# Altium footprint library SG__PCB_HOLE_Connector.PcbLib: 174 footprints (part 2 of 11)
Each footprint in its own frame and in the unit in brackets; x right, y up, seen from the top. Pads: shape width x height; smd on the part's side, far side on the other; paste and mask are expansions set on the pad; w line width, h text height; cw(c..) or ccw(c..) is an arc to the next point about the centre after c.
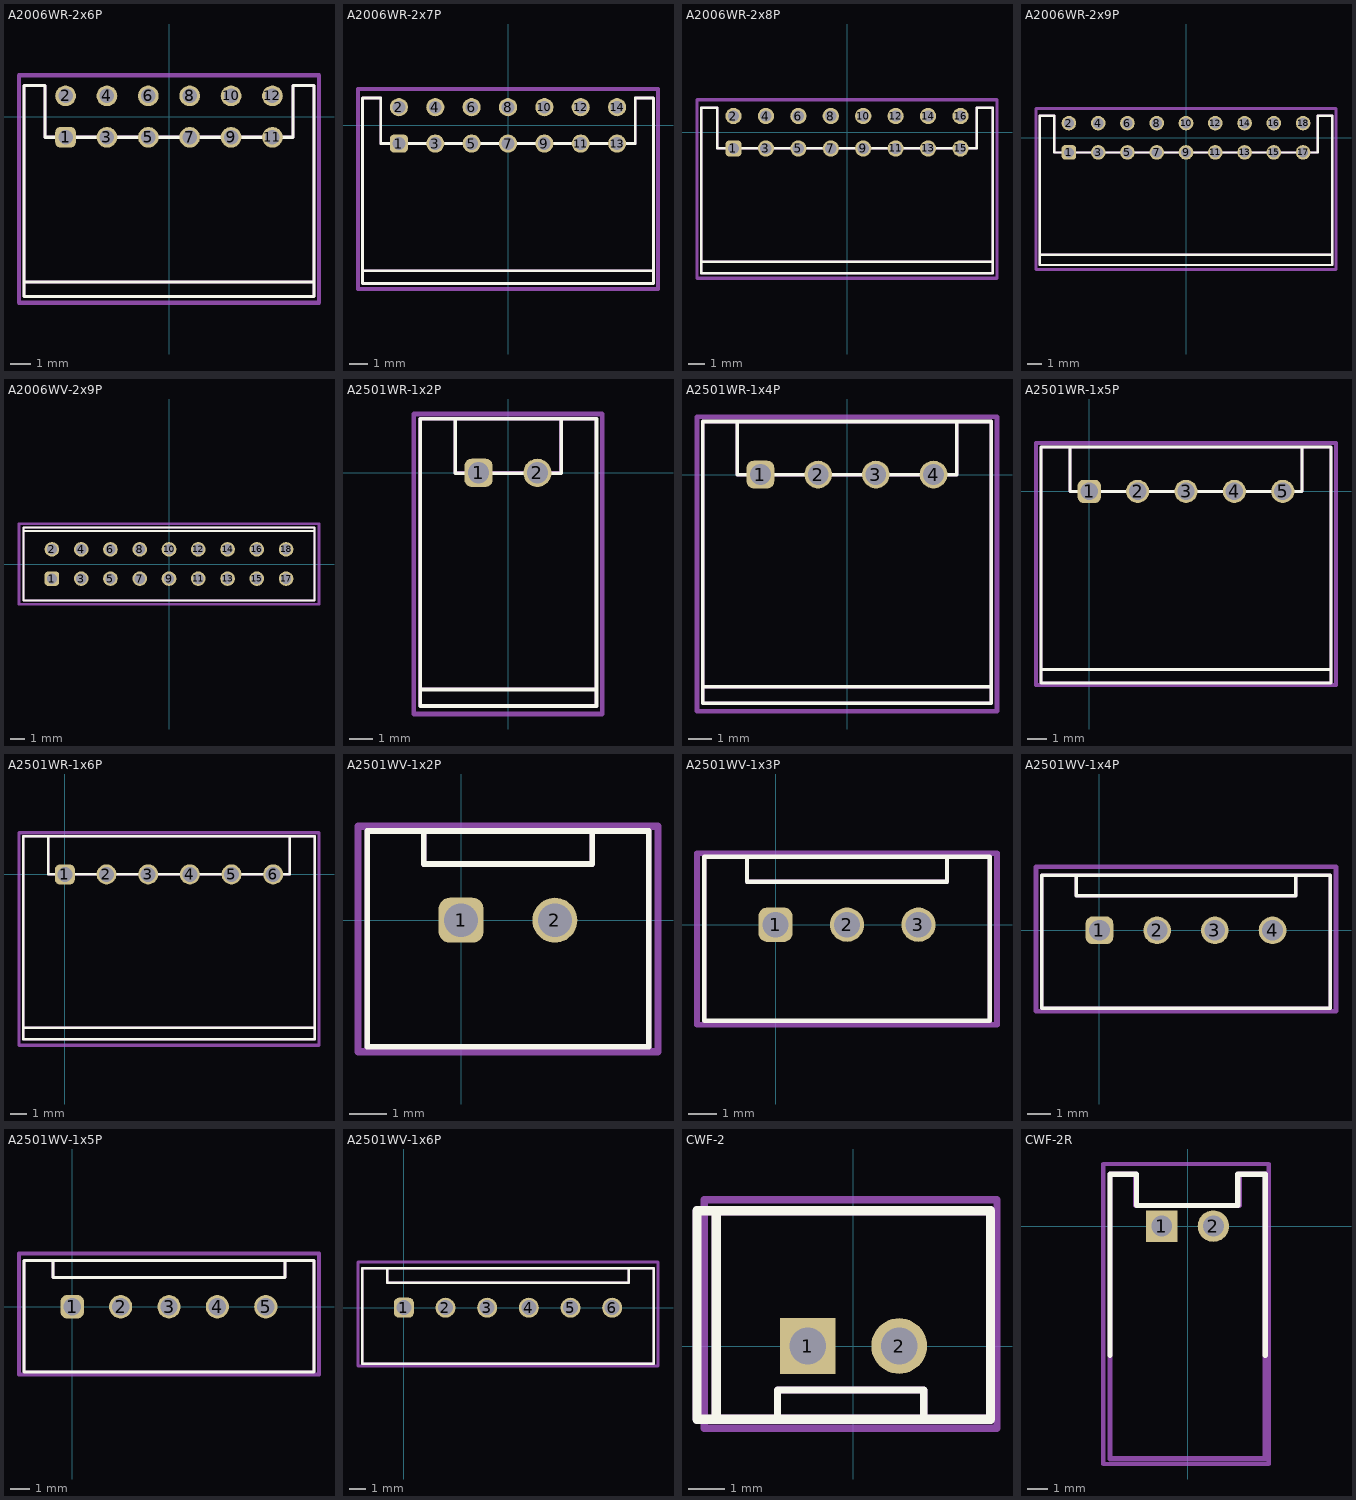
[diagram p1: the footprints below, top view; thin cyan lines are the x and y axes]

## A2006WR-2x6P [mm] "PLD-10-2.0"
pads (12):
  rrect50% 1x1 / inner rrect50% 1.5x1.5 / far side rrect50% 1.6x1.6 hole 0.7: 1(-5,-1)
  round 1 / inner round 1.5 / far side round 1.6 hole 0.7: 2(-5,1) 3(-3,-1) 4(-3,1) 5(-1,-1) 6(-1,1) 7(1,-1) 8(1,1) 9(3,-1) 10(3,1) 11(5,-1) 12(5,1)
Top Overlay:
  lines w0.152: -7,-8 7,-8 ; -6.6,-8.7 -6.4,-8.7 ; -7,-8.7 -5,-8.7 7,-8.7 7,-0.2 7,1.5 6,1.5 6,-1 0,-1 -6,-1 -6,1.5 -7,1.5 -7,-1 -7,-8.7
Top Assembly:
  lines w0.152: -7,-8 7,-8 ; -6.6,-8.7 -6.4,-8.7 ; -7,-8.7 -7,-1 -7,1.5 -6,1.5 -6,-1 0,-1 6,-1 6,1.5 7,1.5 7,-0.2 7,-8.7 -5,-8.7 -7,-8.7
Top Courtyard:
  lines w0.2: -7.25,-9 -7.25,2 7.25,2 7.25,-9 -7.25,-9
3D body: height 5, standoff 0, extent -7,-8.7 7,1.5

## A2006WR-2x7P [mm] "PLD-10-2.0"
pads (14):
  rrect50% 1x1 / inner rrect50% 1.5x1.5 / far side rrect50% 1.6x1.6 hole 0.7: 1(-6,-1)
  round 1 / inner round 1.5 / far side round 1.6 hole 0.7: 2(-6,1) 3(-4,-1) 4(-4,1) 5(-2,-1) 6(-2,1) 7(0,-1) 8(0,1) 9(2,-1) 10(2,1) 11(4,-1) 12(4,1) 13(6,-1) 14(6,1)
Top Overlay:
  lines w0.152: -8,-8 8,-8 ; -7.6,-8.7 -7.4,-8.7 ; -8,-8.7 -8,-1 -8,1.5 -7,1.5 -7,-1 -1,-1 7,-1 7,1.5 8,1.5 8,-8.7 -6,-8.7 -8,-8.7
Top Assembly:
  lines w0.152: -8,-8 8,-8 ; -7.6,-8.7 -7.4,-8.7 ; -8,-8.7 -6,-8.7 8,-8.7 8,1.5 7,1.5 7,-1 -1,-1 -7,-1 -7,1.5 -8,1.5 -8,-1 -8,-8.7
Top Courtyard:
  lines w0.2: -8.25,-9 -8.25,2 8.25,2 8.25,-9 -8.25,-9
3D body: height 5, standoff 0, extent -8,-8.7 8,1.5

## A2006WR-2x8P [mm] "PLD-10-2.0"
pads (16):
  rrect50% 1x1 / inner rrect50% 1.5x1.5 / far side rrect50% 1.6x1.6 hole 0.7: 1(-7,-1)
  round 1 / inner round 1.5 / far side round 1.6 hole 0.7: 2(-7,1) 3(-5,-1) 4(-5,1) 5(-3,-1) 6(-3,1) 7(-1,-1) 8(-1,1) 9(1,-1) 10(1,1) 11(3,-1) 12(3,1) 13(5,-1) 14(5,1) 15(7,-1) 16(7,1)
Top Overlay:
  lines w0.152: -9,-8 9,-8 ; -8.6,-8.7 -8.4,-8.7 ; -9,-8.7 -7,-8.7 9,-8.7 9,-0.2 9,1.5 8,1.5 8,-1 -2,-1 -8,-1 -8,1.5 -9,1.5 -9,-1 -9,-8.7
Top Assembly:
  lines w0.152: -9,-8 9,-8 ; -8.6,-8.7 -8.4,-8.7 ; -9,-8.7 -9,-1 -9,1.5 -8,1.5 -8,-1 -2,-1 8,-1 8,1.5 9,1.5 9,-0.2 9,-8.7 -7,-8.7 -9,-8.7
Top Courtyard:
  lines w0.2: -9.25,-9 9.25,-9 9.25,2 -9.25,2 -9.25,-9
3D body: height 5, standoff 0, extent -9,-8.7 9,1.5

## A2006WR-2x9P [mm] "PLD-18-2.0"
pads (18):
  rrect50% 1x1 / inner rrect50% 1.5x1.5 / far side rrect50% 1.6x1.6 hole 0.7: 1(-8,-1)
  round 1 / inner round 1.5 / far side round 1.6 hole 0.7: 2(-8,1) 3(-6,-1) 4(-6,1) 5(-4,-1) 6(-4,1) 7(-2,-1) 8(-2,1) 9(0,-1) 10(0,1) 11(2,-1) 12(2,1) 13(4,-1) 14(4,1) 15(6,-1) 16(6,1) 17(8,-1) 18(8,1)
Top Overlay:
  lines w0.152: -10,-8 10,-8 ; -9.6,-8.7 -9.4,-8.7 ; -10,-8.7 -10,-1 -10,1.5 -9,1.5 -9,-1 -3,-1 9,-1 9,1.5 10,1.5 10,-2.2 10,-8.7 -8,-8.7 -10,-8.7
Top Assembly:
  lines w0.152: -10,-8 10,-8 ; -9.6,-8.7 -9.4,-8.7 ; -10,-8.7 -8,-8.7 10,-8.7 10,-2.2 10,1.5 9,1.5 9,-1 -3,-1 -9,-1 -9,1.5 -10,1.5 -10,-1 -10,-8.7
Top Courtyard:
  lines w0.2: -10.25,-9 10.25,-9 10.25,2 -10.25,2 -10.25,-9
3D body: height 5, standoff 0, extent -10,-8.7 10,1.5

## A2006WV-2x9P [mm] "PLD-18-2.0"
pads (18):
  rrect50% 1x1 / inner rrect50% 1.5x1.5 / far side rrect50% 1.6x1.6 hole 0.7: 1(-8,-1)
  round 1 / inner round 1.5 / far side round 1.6 hole 0.7: 2(-8,1) 3(-6,-1) 4(-6,1) 5(-4,-1) 6(-4,1) 7(-2,-1) 8(-2,1) 9(0,-1) 10(0,1) 11(2,-1) 12(2,1) 13(4,-1) 14(4,1) 15(6,-1) 16(6,1) 17(8,-1) 18(8,1)
Top Overlay:
  lines w0.152: -9.95,2.25 9.95,2.25 ; -9.95,-2.5 -9.95,2.5 9.95,2.5 9.95,-2.5 -9.95,-2.5
Top Assembly:
  lines w0.152: -9.95,2.25 9.95,2.25 ; -9.95,-2.5 -9.95,2.5 9.95,2.5 9.95,-2.5 -9.95,-2.5
Top Courtyard:
  lines w0.2: -10.25,-2.75 -10.25,2.75 10.25,2.75 10.25,-2.75 -10.25,-2.75
3D body: height 6.5, standoff 0, extent -9.95,-2.5 9.95,2.5

## A2501WR-1x2P [mm] "PLD-2-2.5"
pads (2):
  rrect50% 1.2x1.2 / inner rrect50% 1.5x1.5 / far side rrect50% 1.8x1.8 hole 0.9: 1(-1.25,0)
  round 1.2 / inner round 1.5 / far side round 1.8 hole 0.9: 2(1.25,0)
Top Overlay:
  lines w0.152: -3.738,-9.209 3.762,-9.209 ; -2.238,2.291 -2.238,-0.009 2.262,-0.009 2.262,2.291 ; -3.738,-9.909 3.762,-9.909 3.762,-1.009 3.762,2.291 -3.738,2.291 -3.738,0.491 -3.738,-9.909
Top Assembly:
  lines w0.152: -3.75,-9.2 3.75,-9.2 ; -2.25,2.3 -2.25,0 2.25,0 2.25,2.3 ; -3.75,-9.9 3.75,-9.9 3.75,-1 3.75,2.3 -3.75,2.3 -3.75,0.5 -3.75,-9.9
Top Courtyard:
  lines w0.2: -4,-10.25 4,-10.25 4,2.5 -4,2.5 -4,-10.25
3D body: height 5.75, standoff 0, extent -3.75,-9.9 3.75,2.3

## A2501WR-1x4P [mm] "PLD-2-2.5"
pads (4):
  rrect50% 1.2x1.2 / inner rrect50% 1.5x1.5 / far side rrect50% 1.8x1.8 hole 0.9: 1(-3.75,0)
  round 1.2 / inner round 1.5 / far side round 1.8 hole 0.9: 2(-1.25,0) 3(1.25,0) 4(3.75,0)
Top Overlay:
  lines w0.152: -6.25,-9.2 6.25,-9.2 ; -4.75,2.3 -4.75,0 4.75,0 4.75,2.3 ; -6.25,-9.9 -6.25,0.5 -6.25,2.3 6.25,2.3 6.25,-1 6.25,-9.9 -6.25,-9.9
Top Assembly:
  lines w0.152: -6.25,-9.2 6.25,-9.2 ; -4.75,2.3 -4.75,0 4.75,0 4.75,2.3 ; -6.25,-9.9 -6.25,0.5 -6.25,2.3 6.25,2.3 6.25,-1 6.25,-9.9 -6.25,-9.9
Top Courtyard:
  lines w0.2: -6.5,-10.25 -6.5,2.5 6.5,2.5 6.5,-10.25 -6.5,-10.25
3D body: height 5.75, standoff 0, extent -6.25,-9.9 6.25,2.3

## A2501WR-1x5P [mm] "PLD-2-2.5"
pads (5):
  rrect50% 1.2x1.2 / inner rrect50% 1.5x1.5 / far side rrect50% 1.8x1.8 hole 0.9: 1(0,0)
  round 1.2 / inner round 1.5 / far side round 1.8 hole 0.9: 2(2.5,0) 3(5,0) 4(7.5,0) 5(10,0)
Top Overlay:
  lines w0.152: -2.5,-9.2 12.5,-9.2 ; -1,2.3 -1,0 11,0 11,2.3 ; -2.5,-9.9 12.5,-9.9 12.5,-3.5 12.5,2.3 -2.5,2.3 -2.5,0.5 -2.5,-9.9
Top Assembly:
  lines w0.152: -2.5,-9.2 12.5,-9.2 ; -1,2.3 -1,0 11,0 11,2.3 ; -2.5,-9.9 -2.5,0.5 -2.5,2.3 12.5,2.3 12.5,-3.5 12.5,-9.9 -2.5,-9.9
Top Courtyard:
  lines w0.2: -2.75,-10 12.75,-10 12.75,2.5 -2.75,2.5 -2.75,-10
3D body: height 5.75, standoff 0, extent -2.5,-9.9 12.5,2.3

## A2501WR-1x6P [mm] "PLD-6-2.5"
pads (6):
  rrect50% 1.2x1.2 / inner rrect50% 1.5x1.5 / far side rrect50% 1.8x1.8 hole 0.9: 1(0,0)
  round 1.2 / inner round 1.5 / far side round 1.8 hole 0.9: 2(2.5,0) 3(5,0) 4(7.5,0) 5(10,0) 6(12.5,0)
Top Overlay:
  lines w0.152: -2.5,-9.2 15,-9.2 ; -1,2.3 -1,0 13.5,0 13.5,2.3 ; -2.5,-9.9 -2.5,0.5 -2.5,2.3 15,2.3 15,-6 15,-9.9 -2.5,-9.9
Top Assembly:
  lines w0.152: -2.5,-9.2 15,-9.2 ; -1,2.3 -1,0 13.5,0 13.5,2.3 ; -2.5,-9.9 15,-9.9 15,-6 15,2.3 -2.5,2.3 -2.5,0.5 -2.5,-9.9
Top Courtyard:
  lines w0.2: -2.75,-10.25 -2.75,2.5 15.25,2.5 15.25,-10.25 -2.75,-10.25
3D body: height 5.75, standoff 0, extent -2.5,-9.9 15,2.3

## A2501WV-1x2P [mm] "PLD-2-2.5"
pads (2):
  rrect50% 1.2x1.2 / inner rrect50% 1.5x1.5 / far side rrect50% 1.8x1.8 hole 0.9: 1(0,0)
  round 1.2 / inner round 1.5 / far side round 1.8 hole 0.9: 2(2.5,0)
Top Overlay:
  lines w0.152: -1,2.38 -1,1.5 3.5,1.5 3.5,2.3 ; -2.5,-3.37 -2.5,0.5 -2.5,2.38 5,2.38 5,-3.37 -2.5,-3.37
Top Assembly:
  lines w0.152: -1,2.38 -1,1.5 3.5,1.5 3.5,2.3 ; -2.5,-3.37 -2.5,0.5 -2.5,2.38 5,2.38 5,-3.37 -2.5,-3.37
Top Courtyard:
  lines w0.2: -2.75,-3.5 -2.75,2.5 5.25,2.5 5.25,-3.5 -2.75,-3.5
3D body: height 7, standoff 0, extent -2.5,-3.37 5,2.38

## A2501WV-1x3P [mm] "PLD-2-2.5"
pads (3):
  rrect50% 1.2x1.2 / inner rrect50% 1.5x1.5 / far side rrect50% 1.8x1.8 hole 0.9: 1(0,0)
  round 1.2 / inner round 1.5 / far side round 1.8 hole 0.9: 2(2.5,0) 3(5,0)
Top Overlay:
  lines w0.152: -1,2.383 -1,1.503 6,1.503 6,2.303 ; -2.5,-3.367 -2.5,0.503 -2.5,2.383 7.5,2.383 7.5,0.503 7.5,-3.367 -2.5,-3.367
Top Assembly:
  lines w0.152: -1,2.38 -1,1.5 6,1.5 6,2.3 ; -2.5,-3.37 7.5,-3.37 7.5,0.5 7.5,2.38 -2.5,2.38 -2.5,0.5 -2.5,-3.37
Top Courtyard:
  lines w0.2: -2.75,-3.5 -2.75,2.5 7.75,2.5 7.75,-3.5 -2.75,-3.5
3D body: height 7, standoff 0, extent -2.5,-3.37 7.5,2.38

## A2501WV-1x4P [mm] "PLD-2-2.5"
pads (4):
  rrect50% 1.2x1.2 / inner rrect50% 1.5x1.5 / far side rrect50% 1.8x1.8 hole 0.9: 1(0,0)
  round 1.2 / inner round 1.5 / far side round 1.8 hole 0.9: 2(2.5,0) 3(5,0) 4(7.5,0)
Top Overlay:
  lines w0.152: -1,2.38 -1,1.5 8.5,1.5 8.5,2.3 ; -2.5,-3.37 -2.5,0.5 -2.5,2.38 10,2.38 10,-2 10,-3.37 -2.5,-3.37
Top Assembly:
  lines w0.152: -1,2.38 -1,1.5 8.5,1.5 8.5,2.3 ; -2.5,-3.37 -2.5,0.5 -2.5,2.38 10,2.38 10,-2 10,-3.37 -2.5,-3.37
Top Courtyard:
  lines w0.2: -2.75,-3.5 10.25,-3.5 10.25,2.75 -2.75,2.75 -2.75,-3.5
3D body: height 7, standoff 0, extent -2.5,-3.37 10,2.38

## A2501WV-1x5P [mm] "PLD-2-2.5"
pads (5):
  rrect50% 1.2x1.2 / inner rrect50% 1.5x1.5 / far side rrect50% 1.8x1.8 hole 0.9: 1(0,0)
  round 1.2 / inner round 1.5 / far side round 1.8 hole 0.9: 2(2.5,0) 3(5,0) 4(7.5,0) 5(10,0)
Top Overlay:
  lines w0.152: -1,2.38 -1,1.5 11,1.5 11,2.3 ; -2.5,-3.37 -2.5,0.5 -2.5,2.38 12.5,2.38 12.5,0.5 12.5,-3.37 -2.5,-3.37
Top Assembly:
  lines w0.152: -1,2.38 -1,1.5 11,1.5 11,2.3 ; -2.5,-3.37 -2.5,0.5 -2.5,2.38 12.5,2.38 12.5,0.5 12.5,-3.37 -2.5,-3.37
Top Courtyard:
  lines w0.2: -2.75,-3.5 12.75,-3.5 12.75,2.75 -2.75,2.75 -2.75,-3.5
3D body: height 7, standoff 0, extent -2.5,-3.37 12.5,2.38

## A2501WV-1x6P [mm] "PLD-6-2.5"
pads (6):
  rrect50% 1.2x1.2 / inner rrect50% 1.5x1.5 / far side rrect50% 1.8x1.8 hole 0.9: 1(0,0)
  round 1.2 / inner round 1.5 / far side round 1.8 hole 0.9: 2(2.5,0) 3(5,0) 4(7.5,0) 5(10,0) 6(12.5,0)
Top Overlay:
  lines w0.152: -1,2.38 -1,1.5 13.5,1.5 13.5,2.3 ; -2.5,-3.37 -2.5,0.5 -2.5,2.38 15,2.38 15,1 15,-3.37 -2.5,-3.37
Top Assembly:
  lines w0.152: -1,2.38 -1,1.5 13.5,1.5 13.5,2.3 ; -2.5,-3.37 -2.5,0.5 -2.5,2.38 15,2.38 15,1 15,-3.37 -2.5,-3.37
Top Courtyard:
  lines w0.2: -2.75,-3.5 15.25,-3.5 15.25,2.75 -2.75,2.75 -2.75,-3.5
3D body: height 7, standoff 0, extent -2.5,-3.37 15,2.38

## CWF-2 [mm]
pads (2):
  rect 1.524x1.524 hole 1: 1(-1.25,0)
  round 1.524 hole 1: 2(1.25,0)
Top Overlay:
  lines w0.2: -2.075,-2 1.925,-2 1.925,-1.2 -2.075,-1.2 -2.075,-2
  lines w0.254: -3.75,-2 -4.275,-2 -4.275,3.7 -3.75,3.7 ; -3.75,-2 -3.75,3.7 ; -3.75,-2 3.75,-2 3.75,3.7 -3.75,3.7
Top Assembly:
  lines w0.2: -2.075,-2 1.925,-2 1.925,-1.2 -2.075,-1.2 -2.075,-2
  lines w0.254: -3.75,-2 3.75,-2 3.75,3.7 -3.75,3.7 ; -3.75,-2 -4.275,-2 -4.275,3.7 -3.75,3.7 ; -3.75,-2 -3.75,3.7
Top Courtyard:
  lines w0.2: -4.075,-2.25 3.925,-2.25 3.925,4 -4.075,4 -4.075,-2.25
3D body "CWF2.stp": height 7.9, standoff -1.3, extent -3.75,-2.1 3.75,3.6

## CWF-2R [mm]
pads (2):
  rect 1.524x1.524 hole 1: 1(-1.25,0)
  round 1.524 hole 1: 2(1.25,0)
Top Overlay:
  lines w0.254: -3.75,-6.25 -3.75,2.5 -2.469,2.5 -2.469,1 2.425,1 2.425,2.5 3.75,2.5 3.75,-6.25
Top Assembly:
  lines w0.254: -3.75,-11.25 -3.75,2.5 -2.5,2.5 -2.5,1 2.5,1 2.5,2.5 3.75,2.5 3.75,-11.25 -3.75,-11.25
Top Courtyard:
  lines w0.2: -4.075,-11.5 -4.075,3 3.925,3 3.925,-11.5 -4.075,-11.5
3D body "User Library-DS1069-2 CWF-2R.step": height 5.75, standoff -3.5, extent -3.75,-8.88 3.75,2.62
3D body "User Library-User Library-DS1069F.step": height 5.1, standoff 0, extent -3.35,-11.25 3.35,-3.55